# Altium footprint library main.PcbLib: 217 footprints (part 4 of 14)
Each footprint in its own frame and in the unit in brackets; x right, y up, seen from the top. Pads: shape width x height; smd on the part's side, far side on the other; paste and mask are expansions set on the pad; w line width, h text height; cw(c..) or ccw(c..) is an arc to the next point about the centre after c.
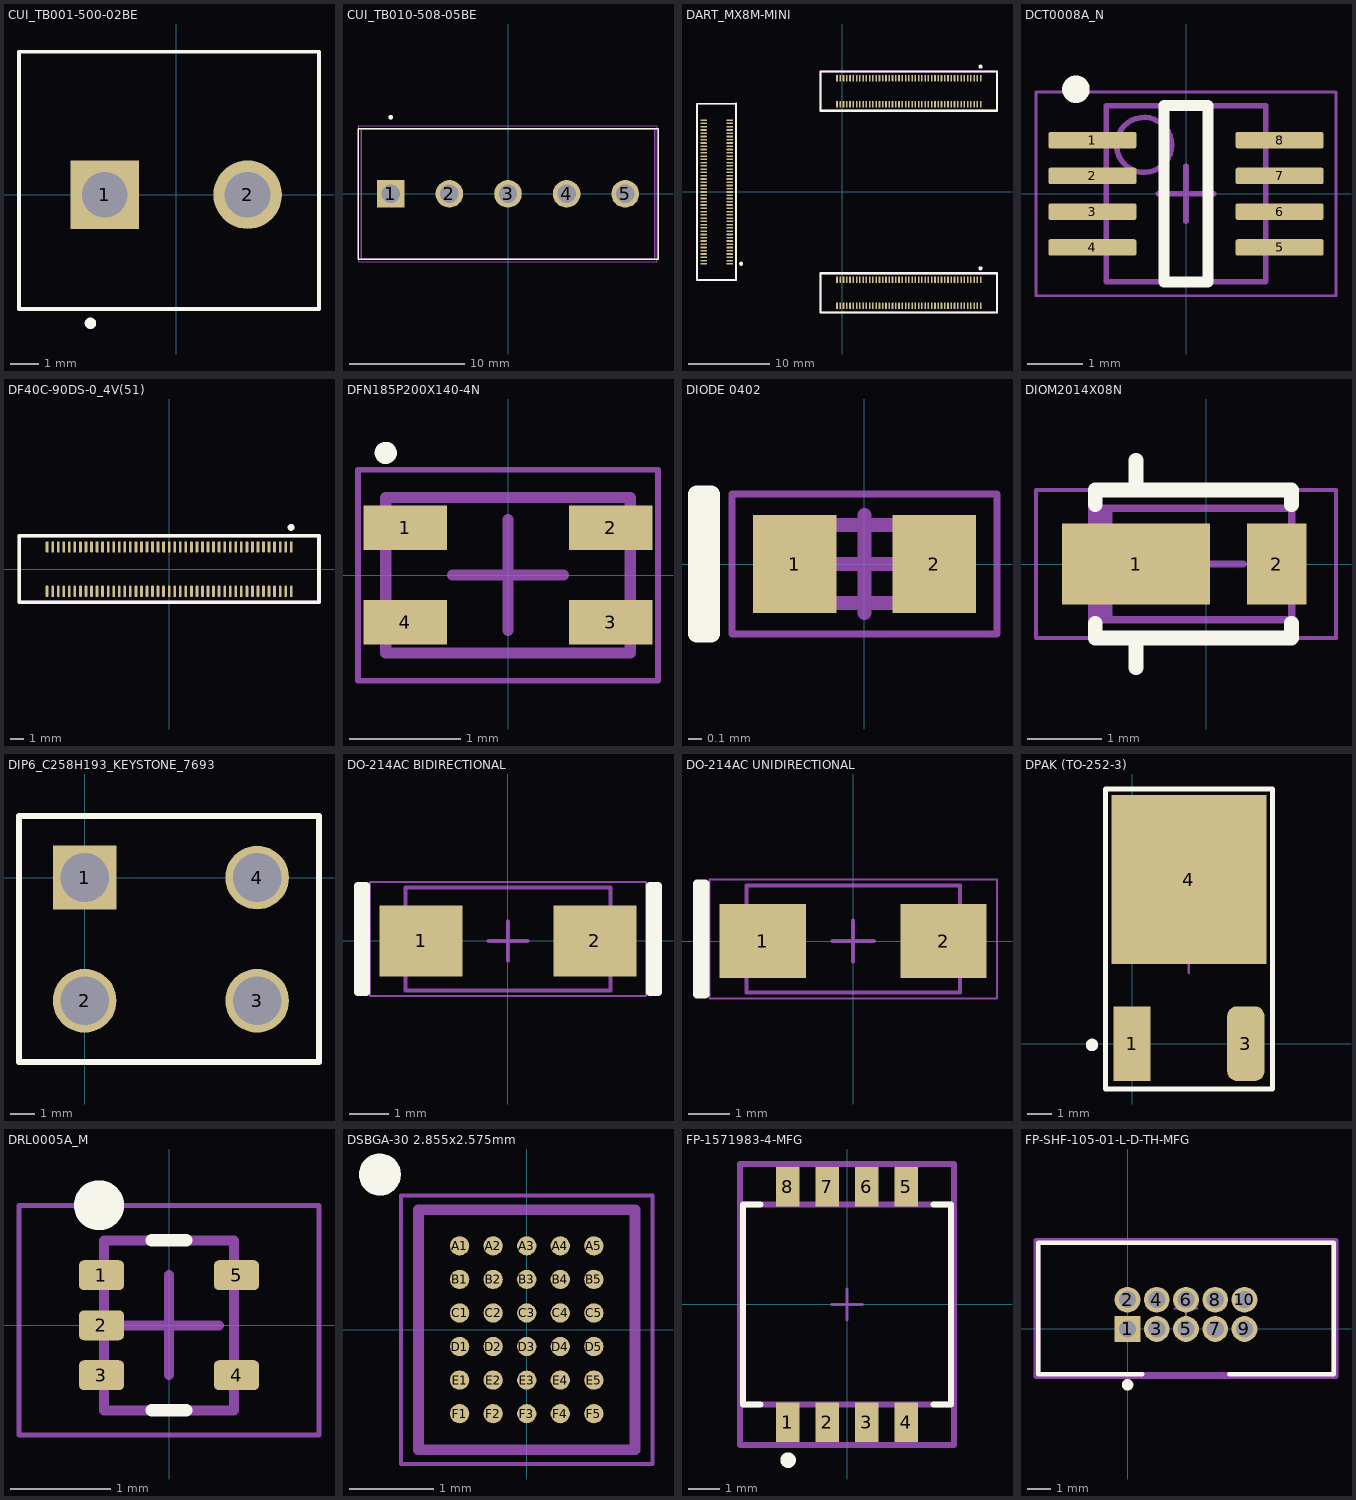
[diagram p3: the footprints below, top view; thin cyan lines are the x and y axes]

## CUI_TB001-500-02BE [mm]
pads (2):
  rect 2.4x2.4 hole 1.6: 1(-2.5,0)
  round 2.4 hole 1.6: 2(2.5,0)
Top Overlay:
  circle w0.2: c-3,-4.5 r0.1
  lines w0.127: -5.5,-4 -5.5,5 5,5 5,-4 -5.5,-4
Mechanical 15:
  lines w0.05: -5.5,-4 -5.5,5 5,5 5,-4 -5.5,-4
3D body "CUI_DEVICES_TB001-500-P02BE.step": height 12.5, standoff -4.4, extent -5.5,-4 5,5

## CUI_TB010-508-05BE [mm]
pads (5):
  rect 2.4x2.4 hole 1.6: 1(-10.16,0)
  round 2.4 hole 1.6: 2(-5.08,0) 3(0,0) 4(5.08,0) 5(10.16,0)
Top Overlay:
  circle w0.2: c-10.16,6.64 r0.1
  lines w0.127: -13,-5.66 13,-5.66 13,5.64 -13,5.64 -13,-5.66
Mechanical 13:
  circle w0.2: c-10.16,6.64 r0.1
  lines w0.127: -12.7,-5.66 -12.7,5.64 12.7,5.64 12.7,-5.66 -12.7,-5.66
Mechanical 15:
  lines w0.05: -12.95,-5.91 -12.95,5.89 12.95,5.89 12.95,-5.91 -12.95,-5.91
3D body "CUI_DEVICES_TB010-508-05BE.step": height 18.25, standoff -3.45, extent -13.1,-5.55 13.1,5.75

## DART_MX8M-MINI [mm] "DART_MX8M-MINI"
pads (270):
  rect 0.2x0.8 smd: J1-1(16.975,13.95) J2-1(16.975,-10.75)
  rrect50% 0.2x0.8 smd: J1-2(16.975,10.75) J1-3(16.575,13.95) J1-4(16.575,10.75) J1-5(16.175,13.95) J1-6(16.175,10.75) J1-7(15.775,13.95) J1-8(15.775,10.75) J1-9(15.375,13.95) J1-10(15.375,10.75) J1-11(14.975,13.95) J1-12(14.975,10.75) J1-13(14.575,13.95) J1-14(14.575,10.75) J1-15(14.175,13.95) J1-16(14.175,10.75) J1-17(13.775,13.95) J1-18(13.775,10.75) J1-19(13.375,13.95) J1-20(13.375,10.75) J1-21(12.975,13.95) J1-22(12.975,10.75) J1-23(12.575,13.95) J1-24(12.575,10.75) J1-25(12.175,13.95) J1-26(12.175,10.75) J1-27(11.775,13.95) J1-28(11.775,10.75) J1-29(11.375,13.95) J1-30(11.375,10.75) J1-31(10.975,13.95) J1-32(10.975,10.75) J1-33(10.575,13.95) J1-34(10.575,10.75) J1-35(10.175,13.95) J1-36(10.175,10.75) J1-37(9.775,13.95) J1-38(9.775,10.75) J1-39(9.375,13.95) J1-40(9.375,10.75) J1-41(8.975,13.95) J1-42(8.975,10.75) J1-43(8.575,13.95) J1-44(8.575,10.75) J1-45(8.175,13.95) J1-46(8.175,10.75) J1-47(7.775,13.95) J1-48(7.775,10.75) J1-49(7.375,13.95) J1-50(7.375,10.75) J1-51(6.975,13.95) J1-52(6.975,10.75) J1-53(6.575,13.95) J1-54(6.575,10.75) J1-55(6.175,13.95) J1-56(6.175,10.75) J1-57(5.775,13.95) J1-58(5.775,10.75) J1-59(5.375,13.95) J1-60(5.375,10.75) J1-61(4.975,13.95) J1-62(4.975,10.75) J1-63(4.575,13.95) J1-64(4.575,10.75) J1-65(4.175,13.95) J1-66(4.175,10.75) J1-67(3.775,13.95) J1-68(3.775,10.75) J1-69(3.375,13.95) J1-70(3.375,10.75) J1-71(2.975,13.95) J1-72(2.975,10.75) J1-73(2.575,13.95) J1-74(2.575,10.75) J1-75(2.175,13.95) J1-76(2.175,10.75) J1-77(1.775,13.95) J1-78(1.775,10.75) J1-79(1.375,13.95) J1-80(1.375,10.75) J1-81(0.975,13.95) J1-82(0.975,10.75) J1-83(0.575,13.95) J1-84(0.575,10.75) J1-85(0.175,13.95) J1-86(0.175,10.75) J1-87(-0.225,13.95) J1-88(-0.225,10.75) J1-89(-0.625,13.95) J1-90(-0.625,10.75) J2-2(16.975,-13.95) J2-3(16.575,-10.75) J2-4(16.575,-13.95) J2-5(16.175,-10.75) J2-6(16.175,-13.95) J2-7(15.775,-10.75) J2-8(15.775,-13.95) J2-9(15.375,-10.75) J2-10(15.375,-13.95) J2-11(14.975,-10.75) J2-12(14.975,-13.95) J2-13(14.575,-10.75) J2-14(14.575,-13.95) J2-15(14.175,-10.75) J2-16(14.175,-13.95) J2-17(13.775,-10.75) J2-18(13.775,-13.95) J2-19(13.375,-10.75) J2-20(13.375,-13.95) J2-21(12.975,-10.75) J2-22(12.975,-13.95) J2-23(12.575,-10.75) J2-24(12.575,-13.95) J2-25(12.175,-10.75) J2-26(12.175,-13.95) J2-27(11.775,-10.75) J2-28(11.775,-13.95) J2-29(11.375,-10.75) J2-30(11.375,-13.95) J2-31(10.975,-10.75) J2-32(10.975,-13.95) J2-33(10.575,-10.75) J2-34(10.575,-13.95) J2-35(10.175,-10.75) J2-36(10.175,-13.95) J2-37(9.775,-10.75) J2-38(9.775,-13.95) J2-39(9.375,-10.75) J2-40(9.375,-13.95) J2-41(8.975,-10.75) J2-42(8.975,-13.95) J2-43(8.575,-10.75) J2-44(8.575,-13.95) J2-45(8.175,-10.75) J2-46(8.175,-13.95) J2-47(7.775,-10.75) J2-48(7.775,-13.95) J2-49(7.375,-10.75) J2-50(7.375,-13.95) J2-51(6.975,-10.75) J2-52(6.975,-13.95) J2-53(6.575,-10.75) J2-54(6.575,-13.95) J2-55(6.175,-10.75) J2-56(6.175,-13.95) J2-57(5.775,-10.75) J2-58(5.775,-13.95) J2-59(5.375,-10.75) J2-60(5.375,-13.95) J2-61(4.975,-10.75) J2-62(4.975,-13.95) J2-63(4.575,-10.75) J2-64(4.575,-13.95) J2-65(4.175,-10.75) J2-66(4.175,-13.95) J2-67(3.775,-10.75) J2-68(3.775,-13.95) J2-69(3.375,-10.75) J2-70(3.375,-13.95) J2-71(2.975,-10.75) J2-72(2.975,-13.95) J2-73(2.575,-10.75) J2-74(2.575,-13.95) J2-75(2.175,-10.75) J2-76(2.175,-13.95) J2-77(1.775,-10.75) J2-78(1.775,-13.95) J2-79(1.375,-10.75) J2-80(1.375,-13.95) J2-81(0.975,-10.75) J2-82(0.975,-13.95) J2-83(0.575,-10.75) J2-84(0.575,-13.95) J2-85(0.175,-10.75) J2-86(0.175,-13.95) J2-87(-0.225,-10.75) J2-88(-0.225,-13.95) J2-89(-0.625,-10.75) J2-90(-0.625,-13.95)
  rect 0.8x0.2 smd: J3-1(-13.775,-8.8)
  rrect50% 0.8x0.2 smd: J3-2(-16.975,-8.8) J3-3(-13.775,-8.4) J3-4(-16.975,-8.4) J3-5(-13.775,-8) J3-6(-16.975,-8) J3-7(-13.775,-7.6) J3-8(-16.975,-7.6) J3-9(-13.775,-7.2) J3-10(-16.975,-7.2) J3-11(-13.775,-6.8) J3-12(-16.975,-6.8) J3-13(-13.775,-6.4) J3-14(-16.975,-6.4) J3-15(-13.775,-6) J3-16(-16.975,-6) J3-17(-13.775,-5.6) J3-18(-16.975,-5.6) J3-19(-13.775,-5.2) J3-20(-16.975,-5.2) J3-21(-13.775,-4.8) J3-22(-16.975,-4.8) J3-23(-13.775,-4.4) J3-24(-16.975,-4.4) J3-25(-13.775,-4) J3-26(-16.975,-4) J3-27(-13.775,-3.6) J3-28(-16.975,-3.6) J3-29(-13.775,-3.2) J3-30(-16.975,-3.2) J3-31(-13.775,-2.8) J3-32(-16.975,-2.8) J3-33(-13.775,-2.4) J3-34(-16.975,-2.4) J3-35(-13.775,-2) J3-36(-16.975,-2) J3-37(-13.775,-1.6) J3-38(-16.975,-1.6) J3-39(-13.775,-1.2) J3-40(-16.975,-1.2) J3-41(-13.775,-0.8) J3-42(-16.975,-0.8) J3-43(-13.775,-0.4) J3-44(-16.975,-0.4) J3-45(-13.775,0) J3-46(-16.975,0) J3-47(-13.775,0.4) J3-48(-16.975,0.4) J3-49(-13.775,0.8) J3-50(-16.975,0.8) J3-51(-13.775,1.2) J3-52(-16.975,1.2) J3-53(-13.775,1.6) J3-54(-16.975,1.6) J3-55(-13.775,2) J3-56(-16.975,2) J3-57(-13.775,2.4) J3-58(-16.975,2.4) J3-59(-13.775,2.8) J3-60(-16.975,2.8) J3-61(-13.775,3.2) J3-62(-16.975,3.2) J3-63(-13.775,3.6) J3-64(-16.975,3.6) J3-65(-13.775,4) J3-66(-16.975,4) J3-67(-13.775,4.4) J3-68(-16.975,4.4) J3-69(-13.775,4.8) J3-70(-16.975,4.8) J3-71(-13.775,5.2) J3-72(-16.975,5.2) J3-73(-13.775,5.6) J3-74(-16.975,5.6) J3-75(-13.775,6) J3-76(-16.975,6) J3-77(-13.775,6.4) J3-78(-16.975,6.4) J3-79(-13.775,6.8) J3-80(-16.975,6.8) J3-81(-13.775,7.2) J3-82(-16.975,7.2) J3-83(-13.775,7.6) J3-84(-16.975,7.6) J3-85(-13.775,8) J3-86(-16.975,8) J3-87(-13.775,8.4) J3-88(-16.975,8.4) J3-89(-13.775,8.8) J3-90(-16.975,8.8)
Top Overlay:
  circle w0.25: c16.965,-9.35 r0.125
  circle w0.25: c-12.365,-8.79 r0.125
  circle w0.25: c16.965,15.36 r0.125
  lines w0.254: -17.775,-10.8 -12.975,-10.8 -12.975,10.826 -17.775,10.781 -17.775,-10.8 ; -2.625,-14.75 -2.625,-9.95 18.975,-9.95 18.975,-14.75 -2.625,-14.75 ; -2.625,9.95 -2.625,14.75 18.975,14.75 18.975,9.95 -2.625,9.95
Mechanical 7:
  text ".Designator" at 0.515,-13.58 h1.52
  text ".Designator" at -16.055,7.66 h1.52
  text ".Designator" at 0.515,11.67 h1.52
Mechanical 15:
  lines w0.254: -2.651,14.75 18.975,14.75 18.975,9.95 -2.606,9.95 ; -2.625,9.95 -2.625,14.75 ; -17.775,-10.8 -17.775,10.781 -12.975,10.826 -12.975,-10.8 -17.775,-10.8 ; -2.625,-14.75 -2.625,-9.95 18.975,-9.95 18.975,-14.75 -2.625,-14.75
3D body "DF40C-90DS.stp": height 1.4, standoff -0.05, extent -2.125,-14.04 18.475,-10.66
3D body "DF40C-90DS.stp": height 1.4, standoff -0.05, extent -17.065,-10.3 -13.685,10.3
3D body "DF40C-90DS.stp": height 1.4, standoff -0.05, extent -2.125,10.66 18.475,14.04
3D body "DART-MX8M-MINI.STEP": height 5.43, standoff 1.2, extent -18.114,-15.05 37.065,15.062

## DCT0008A_N [mm] "SOP, 8-Leads, Body 2.9x3.2mm, Pitch 0.65mm, IPC Medium Density"
height 1.3
pads (8):
  rrect25% 1.6x0.3 smd: 1(-1.7,0.975) 2(-1.7,0.325) 3(-1.7,-0.325) 4(-1.7,-0.975) 5(1.7,-0.975) 6(1.7,-0.325) 7(1.7,0.325) 8(1.7,0.975)
Top Overlay:
  circle w0.25: c-2,1.9 r0.125
  lines w0.2: -0.4,-1.6 0.4,-1.6 0.4,1.6 -0.4,1.6 -0.4,-1.6
Mechanical 7:
  text ".Designator" at -2.159,-1.143 h1.52
Mechanical 13:
  circle w0.1: c-0.762,0.889 r0.5
  lines w0.1: -1.45,-1.6 1.45,-1.6 1.45,1.6 -1.45,1.6 -1.45,-1.6
Mechanical 15:
  lines w0.05: -2.725,-1.85 2.725,-1.85 2.725,1.85 -2.725,1.85 -2.725,-1.85
  lines w0.1: -0.5,0 0.5,0 ; 0,-0.5 0,0.5
3D body "DCT0008A.stp": height 1.3, standoff 0, extent -2.011,-1.475 2.011,1.475

## DF40C-90DS-0_4V(51) [mm] "DF40C-90DS-0_4V(51)"
pads (90):
  rect 0.2x0.8 smd: 1(8.8,1.6)
  rrect50% 0.2x0.8 smd: 2(8.8,-1.6) 3(8.4,1.6) 4(8.4,-1.6) 5(8,1.6) 6(8,-1.6) 7(7.6,1.6) 8(7.6,-1.6) 9(7.2,1.6) 10(7.2,-1.6) 11(6.8,1.6) 12(6.8,-1.6) 13(6.4,1.6) 14(6.4,-1.6) 15(6,1.6) 16(6,-1.6) 17(5.6,1.6) 18(5.6,-1.6) 19(5.2,1.6) 20(5.2,-1.6) 21(4.8,1.6) 22(4.8,-1.6) 23(4.4,1.6) 24(4.4,-1.6) 25(4,1.6) 26(4,-1.6) 27(3.6,1.6) 28(3.6,-1.6) 29(3.2,1.6) 30(3.2,-1.6) 31(2.8,1.6) 32(2.8,-1.6) 33(2.4,1.6) 34(2.4,-1.6) 35(2,1.6) 36(2,-1.6) 37(1.6,1.6) 38(1.6,-1.6) 39(1.2,1.6) 40(1.2,-1.6) 41(0.8,1.6) 42(0.8,-1.6) 43(0.4,1.6) 44(0.4,-1.6) 45(0,1.6) 46(0,-1.6) 47(-0.4,1.6) 48(-0.4,-1.6) 49(-0.8,1.6) 50(-0.8,-1.6) 51(-1.2,1.6) 52(-1.2,-1.6) 53(-1.6,1.6) 54(-1.6,-1.6) 55(-2,1.6) 56(-2,-1.6) 57(-2.4,1.6) 58(-2.4,-1.6) 59(-2.8,1.6) 60(-2.8,-1.6) 61(-3.2,1.6) 62(-3.2,-1.6) 63(-3.6,1.6) 64(-3.6,-1.6) 65(-4,1.6) 66(-4,-1.6) 67(-4.4,1.6) 68(-4.4,-1.6) 69(-4.8,1.6) 70(-4.8,-1.6) 71(-5.2,1.6) 72(-5.2,-1.6) 73(-5.6,1.6) 74(-5.6,-1.6) 75(-6,1.6) 76(-6,-1.6) 77(-6.4,1.6) 78(-6.4,-1.6) 79(-6.8,1.6) 80(-6.8,-1.6) 81(-7.2,1.6) 82(-7.2,-1.6) 83(-7.6,1.6) 84(-7.6,-1.6) 85(-8,1.6) 86(-8,-1.6) 87(-8.4,1.6) 88(-8.4,-1.6) 89(-8.8,1.6) 90(-8.8,-1.6)
Top Overlay:
  circle w0.25: c8.79,3.01 r0.125
  lines w0.254: -10.8,-2.4 -10.8,2.4 10.8,2.4 10.8,-2.4 -10.8,-2.4
Mechanical 7:
  text ".Designator" at -7.66,-0.68 h1.52
Mechanical 15:
  lines w0.254: -10.826,2.4 10.8,2.4 10.8,-2.4 -10.781,-2.4 ; -10.8,-2.4 -10.8,2.4
3D body "DF40C-90DS.stp": height 1.4, standoff -0.05, extent -10.3,-1.69 10.3,1.69

## DFN185P200X140-4N [mm] "DFN, 4-Leads, Body 1.20x2.00mm, Pitch 1.85mm, IPC Medium Density"
height 1.4
pads (4):
  rect 0.75x0.4 smd: 1(-0.925,0.425) 2(0.925,0.425) 3(0.925,-0.425) 4(-0.925,-0.425)
Top Overlay:
  circle w0.1: c-1.1,1.1 r0.05
Mechanical 7:
  text ".Designator" at -1.105,-1.119 h1
Mechanical 13:
  lines w0.1: -1.1,-0.7 1.1,-0.7 1.1,0.7 -1.1,0.7 -1.1,-0.7
Mechanical 15:
  lines w0.05: -1.35,-0.95 1.35,-0.95 1.35,0.95 -1.35,0.95 -1.35,-0.95
  lines w0.1: -0.5,0 0.5,0 ; 0,-0.5 0,0.5
3D body "User Library-SRF2012A.STEP": height 1.2, standoff 0.01, extent -1,-0.6 1,0.6

## DIODE 0402 [mm] "DIODE 0402"
height 0.4
pads (2):
  rect 0.6x0.7 smd: 1(-0.5,0) 2(0.5,0)
Top Overlay:
  lines w0.127: -1.2,-0.5 -1.2,0.5 -1.1,0.5 -1.1,-0.5 -1.2,-0.5
Mechanical 7:
  text ".Designator" at -0.66,-0.28 h0.76
Mechanical 13:
  lines w0.1: -0.53,-0.28 -0.53,0.28 0.53,0.28 0.53,-0.28 -0.53,-0.28
Mechanical 15:
  lines w0.05: -0.95,-0.5 -0.95,0.5 0.95,0.5 0.95,-0.5 -0.95,-0.5
  lines w0.1: -0.35,0 0.35,0 ; 0,-0.35 0,0.35
3D body "YAG_R0402_YAG.step": height 0.41, standoff 0, extent -0.533,-0.279 0.533,0.279

## DIOM2014X08N [mm] "RHOM TUMD2M - Molded Diode, 2-Leads, Body 2.00x1.40mm, IPC Medium Density"
height 0.8
pads (2):
  rect 2x1.1 smd: 1(-0.95,0)
  rect 0.8x1.1 smd: 2(0.95,0)
Top Overlay:
  lines w0.2: -1.5,-0.8 -1.5,-1 1.15,-1 1.15,-0.8 ; -1.5,0.8 -1.5,1 1.15,1 1.15,0.8 ; -0.95,-1.4 -0.95,-1 ; -0.95,1 -0.95,1.4
Mechanical 7:
  text ".Designator" at -3.4,-0.7 h1.52
Mechanical 13:
  rectangle: -1.55,-0.75 -1.268,0.75
  lines w0.1: -1.55,-0.75 -1.55,0.75 1.15,0.75 1.15,-0.75 -1.55,-0.75
Mechanical 15:
  lines w0.05: -2.3,-1 -2.3,1 1.75,1 1.75,-1 -2.3,-1
  lines w0.1: -0.5,0 0.5,0 ; 0,-0.5 0,0.5
3D body: height 0.8, standoff 0, extent -1.55,-0.75 0.55,0.75

## DIP6_C258H193_KEYSTONE_7693 [mil]
height 250
pads (4):
  rect 102x102 hole 78: 1(0,0)
  round 102 hole 78: 2(0,-197) 3(276,-197) 4(276,0)
Top Overlay:
  lines w10: -105,-295 -105,98.5 375,98.5 375,-295 -105,-295
Mechanical 7:
  text ".Designator" at -30,-125 h60
Mechanical 15:
  lines w10: -105,-295 375,-295 375,98.5 -105,98.5 -105,-295
3D body "keystone-PN7693.STEP": height 327.21, standoff -187.21, extent -43.02,-255 313.01,55

## DO-214AC BIDIRECTIONAL [mm] "DO-214AC BIDIRECTIONAL"
height 0.65
pads (2):
  rect 2.1x1.8 smd: 1(-2.2,0) 2(2.2,0)
Top Overlay:
  lines w0.2: -3.8,-1.3 -3.8,1.4 -3.6,1.4 -3.6,-1.3 -3.8,-1.3 ; 3.6,-1.3 3.6,1.4 3.8,1.4 3.8,-1.3 3.6,-1.3
Mechanical 7:
  text ".Designator" at -1.325,-0.454 h0.76
Mechanical 13:
  lines w0.1: -2.6,-1.25 -2.6,1.35 2.6,1.35 2.6,-1.25 -2.6,-1.25
Mechanical 15:
  lines w0.05: -3.5,-1.4 3.5,-1.4 3.5,1.5 -3.5,1.5 -3.5,-1.4
  lines w0.1: -0.5,0 0.5,0 ; 0,-0.5 0,0.5
3D body "User Library-DO-214AC SMA.step": height 2.4, standoff 0, extent -2.6,-1.25 2.6,1.35

## DO-214AC UNIDIRECTIONAL [mm] "DO-214AC UNIDIRECTIONAL"
height 0.65
pads (2):
  rect 2.1x1.8 smd: 1(-2.2,0) 2(2.2,0)
Top Overlay:
  lines w0.2: -3.8,-1.3 -3.6,-1.3 -3.6,1.4 -3.8,1.4 -3.8,-1.3
Mechanical 7:
  text ".Designator" at -1.325,-0.454 h0.76
Mechanical 13:
  lines w0.1: -2.6,-1.25 2.6,-1.25 2.6,1.35 -2.6,1.35 -2.6,-1.25
Mechanical 15:
  lines w0.05: -3.5,-1.4 -3.5,1.5 3.5,1.5 3.5,-1.4 -3.5,-1.4
  lines w0.1: -0.5,0 0.5,0 ; 0,-0.5 0,0.5
3D body "User Library-DO-214AC SMA.step": height 2.4, standoff 0, extent -2.6,-1.25 2.6,1.35

## DPAK (TO-252-3) [mm] "DPAK (TO-252-3)"
height 1.1
pads (3):
  rect 1.5x3 smd: 1(0,0)
  rrect50% 1.5x3 smd: 3(4.58,0)
  rect 6.25x6.8 smd: 4(2.29,6.6)
Top Overlay:
  circle w0.25: c-1.61,-0.05 r0.125
  lines w0.2: -1.075,-1.825 -1.075,10.25 5.65,10.25 5.65,-1.825 -1.075,-1.825
Mechanical 15:
  lines w0.1: 1.79,3.35 2.79,3.35 ; 2.29,2.85 2.29,3.85
3D body "User Library-DPAK-1.step": height 2.34, standoff -0.07, extent -0.975,-0.4 5.565,9.538

## DRL0005A_M [mm] "SOT23, 5-Leads, Body 1.7x1.3mm, Pitch 0.5mm, IPC Low Density"
height 0.6
pads (5):
  rrect33% 0.45x0.3 smd mask+0.05: 1(-0.675,0.5) 2(-0.675,0) 3(-0.675,-0.5) 4(0.675,-0.5) 5(0.675,0.5)
Top Overlay:
  circle w0.25: c-0.7,1.2 r0.125
  lines w0.125: -0.175,-0.85 0.175,-0.85 ; -0.175,0.85 0.175,0.85
Mechanical 7:
  text ".Designator" at -1.31,-0.79 h0.3
Mechanical 13:
  lines w0.1: -0.65,-0.85 -0.65,0.85 0.65,0.85 0.65,-0.85 -0.65,-0.85
Mechanical 15:
  lines w0.05: -1.5,-1.1 -1.5,1.2 1.5,1.2 1.5,-1.1 -1.5,-1.1
  lines w0.1: -0.5,0 0.5,0 ; 0,-0.5 0,0.5
3D body: height 0.6, standoff 0, extent -0.65,-0.85 0.65,0.85

## DSBGA-30 2.855x2.575mm [mm] "DSBGA-30 2.855x2.675mm"
pads (30):
  round 0.23 smd mask+0.05: A1(-0.8,1) A2(-0.4,1) A3(0,1) A4(0.4,1) A5(0.8,1) B1(-0.8,0.6) B2(-0.4,0.6) B3(0,0.6) B4(0.4,0.6) B5(0.8,0.6) C1(-0.8,0.2) C2(-0.4,0.2) C3(0,0.2) C4(0.4,0.2) C5(0.8,0.2) D1(-0.8,-0.2) D2(-0.4,-0.2) D3(0,-0.2) D4(0.4,-0.2) D5(0.8,-0.2) E1(-0.8,-0.6) E2(-0.4,-0.6) E3(0,-0.6) E4(0.4,-0.6) E5(0.8,-0.6) F1(-0.8,-1) F2(-0.4,-1) F3(0,-1) F4(0.4,-1) F5(0.8,-1)
Top Overlay:
  circle w0.25: c-1.75,1.85 r0.125
Mechanical 7:
  text ".Designator" at -0.8,-0.5 h1.52
Mechanical 13:
  lines w0.127: -1.29,-1.43 -1.29,1.43 1.29,1.43 1.29,-1.43 -1.29,-1.43
  lines w0.2: -1.75,1.85 ccw(c-1.847,1.876) -1.747,1.865
Mechanical 15:
  lines w0.05: -1.5,-1.6 -1.5,1.6 1.5,1.6 1.5,-1.6 -1.5,-1.6
3D body: height 0.33, standoff 0, extent -1.29,-1.43 1.29,1.43

## FP-1571983-4-MFG [mm]
pads (8):
  rect 0.76x1.27 smd: 1(-1.905,-3.795) 2(-0.635,-3.795) 3(0.635,-3.795) 4(1.905,-3.795) 5(1.905,3.795) 6(0.635,3.795) 7(-0.635,3.795) 8(-1.905,3.795)
Top Overlay:
  circle w0.25: c-1.9,-5.02 r0.125
  lines w0.2: -2.8,-3.225 -3.355,-3.225 -3.355,3.225 -2.8,3.225 ; 2.8,-3.225 3.355,-3.225 3.355,3.225 2.8,3.225
Mechanical 7:
  text ".Designator" at -2.835,-2.131 h1.52
Mechanical 13:
  lines w0.2: -3.355,-3.225 -3.355,3.225 3.355,3.225 3.355,-3.225 -3.355,-3.225
Mechanical 15:
  lines w0.1: -0.5,0 0.5,0 ; 0,-0.5 0,0.5
  lines w0.2: -3.455,-4.53 -3.455,4.53 3.455,4.53 3.455,-4.53 -3.455,-4.53
3D body "Switch_TE_Connectivity_1571983-4_eec.STEP": height 0.25, standoff 0, extent -3.455,-4.53 3.455,4.53

## FP-SHF-105-01-L-D-TH-MFG [mm]
pads (10):
  rect 1.12x1.12 hole 0.74 paste-1000 mask+0: 1(0,0)
  round 1.12 hole 0.74 paste-1000 mask+0: 2(0,1.27) 3(1.27,0) 4(1.27,1.27) 5(2.54,0) 6(2.54,1.27) 7(3.81,0) 8(3.81,1.27) 9(5.08,0) 10(5.08,1.27)
Top Overlay:
  circle w0.25: c0,-2.425 r0.125
  lines w0.2: 0.64,-1.97 -3.875,-1.97 -3.875,3.75 8.955,3.75 8.955,-1.97 ; 4.425,-1.97 8.94,-1.97
Mechanical 7:
  text ".Designator" at -1.695,-0.541 h1.52
Mechanical 13:
  lines w0.2: -3.875,-1.97 8.955,-1.97 8.955,3.75 -3.875,3.75 -3.875,-1.97
Mechanical 15:
  lines w0.2: -3.975,-2.07 9.055,-2.07 9.055,3.85 -3.975,3.85 -3.975,-2.07
Mechanical 16:
  lines w0.1: 2.04,0.89 3.04,0.89 ; 2.54,0.39 2.54,1.39
3D body "Conn_Samtec_SHF-105-01-L-D-TH_eec.STEP": height 0.25, standoff 0, extent -3.975,-2.07 9.055,3.85